# Altium footprint library Connector_PinHeader_2.00mm.PcbLib: 278 footprints (part 1 of 18)
Each footprint in its own frame and in the unit in brackets; x right, y up, seen from the top. Pads: shape width x height; smd on the part's side, far side on the other; paste and mask are expansions set on the pad; w line width, h text height; cw(c..) or ccw(c..) is an arc to the next point about the centre after c.
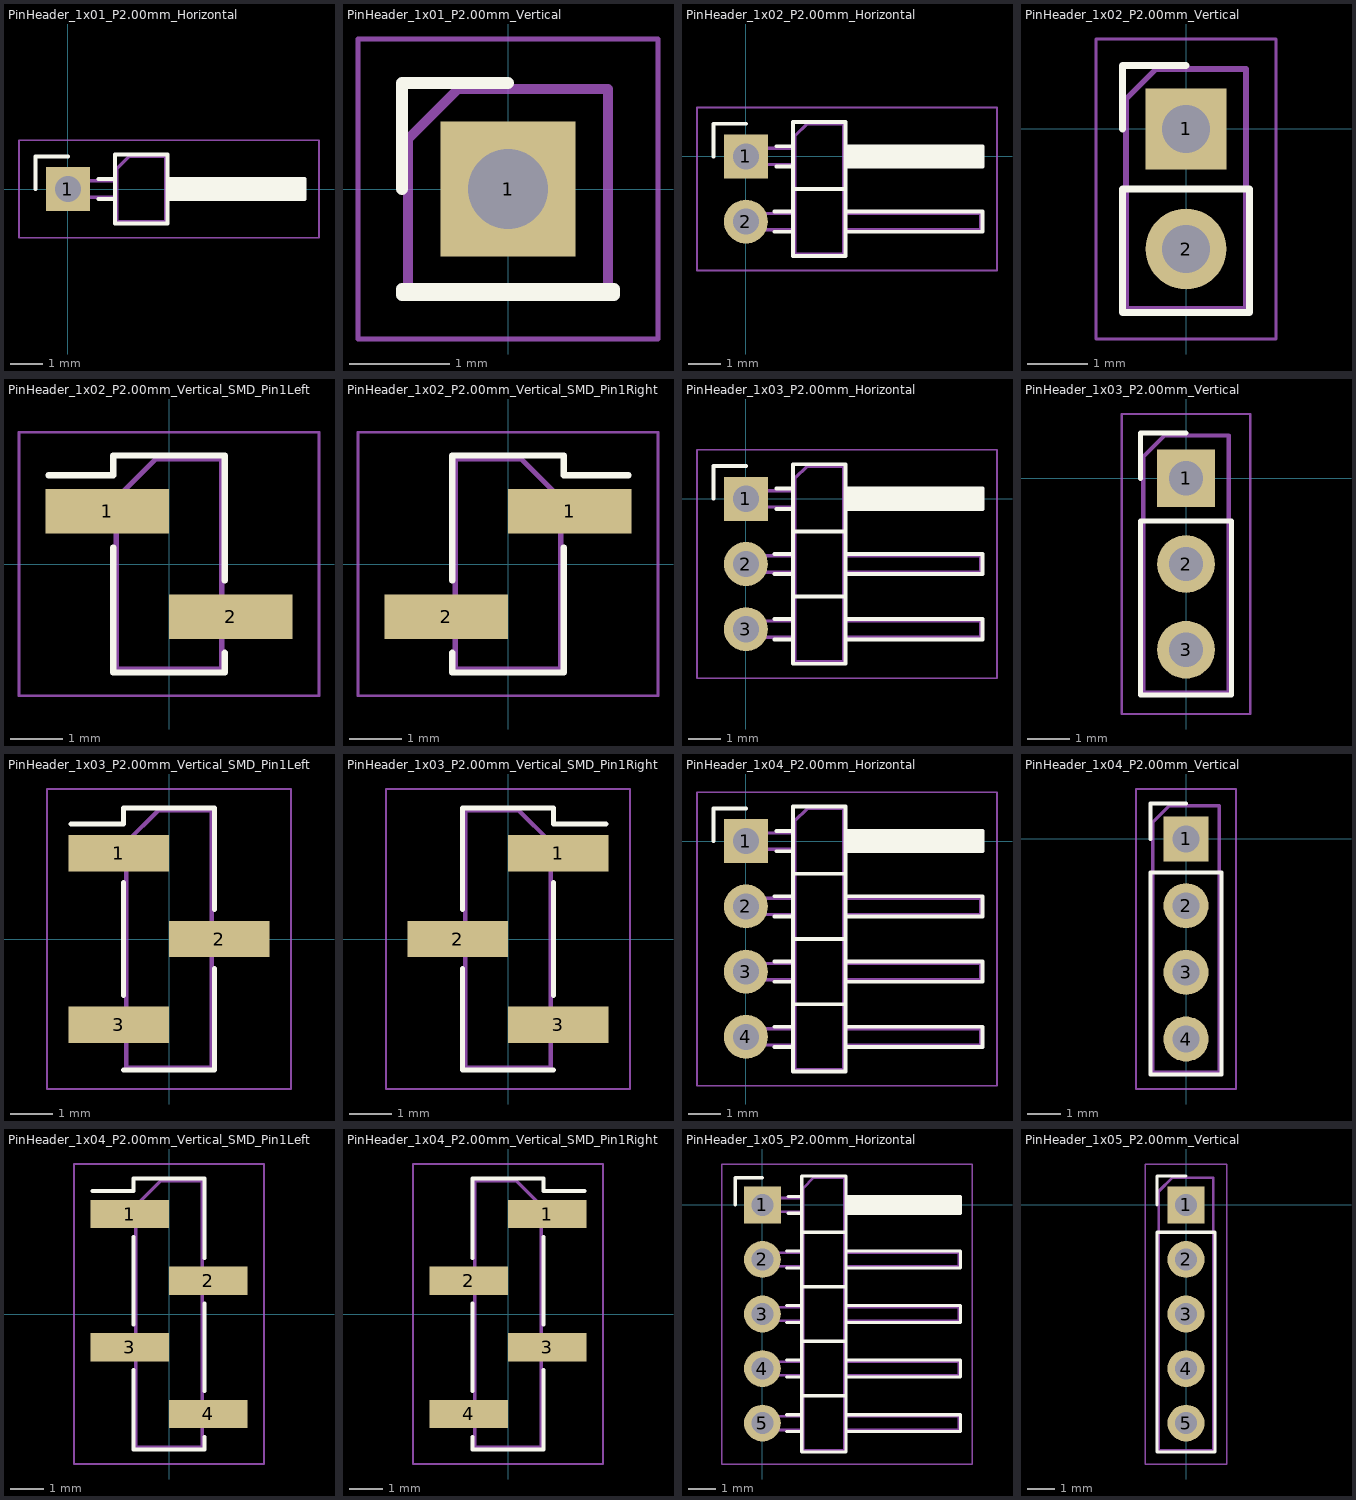
[diagram p0: the footprints below, top view; thin cyan lines are the x and y axes]

## PinHeader_1x01_P2.00mm_Horizontal [mm]
pads (1):
  rect 1.35x1.35 hole 0.8: 1(0,0)
F.SilkS:
  lines w0.12: -1,0 -1,1 0,1 ; 0.935,-0.31 1.44,-0.31 ; 0.935,0.31 1.44,0.31 ; 3.06,-0.31 7.26,-0.31 7.26,0.31 3.06,0.31 ; 3.06,-0.23 7.26,-0.23 ; 3.06,-0.11 7.26,-0.11 ; 3.06,0.01 7.26,0.01 ; 3.06,0.13 7.26,0.13 ; 3.06,0.25 7.26,0.25 ; 1.44,-1.06 1.44,1.06 3.06,1.06 3.06,-1.06 1.44,-1.06
F.CrtYd:
  lines w0.05: -1.5,-1.5 7.7,-1.5 7.7,1.5 -1.5,1.5 -1.5,-1.5
F.Fab:
  lines w0.1: 1.5,-0.25 -0.25,-0.25 -0.25,0.25 1.5,0.25 ; 3,-0.25 7.2,-0.25 7.2,0.25 3,0.25 ; 1.5,-1 1.5,0.625 1.875,1 3,1 3,-1 1.5,-1
  text "'.Designator'" at 3.006,-3.642 h0.9

## PinHeader_1x01_P2.00mm_Vertical [mm]
pads (1):
  rect 1.35x1.35 hole 0.8: 1(0,0)
F.SilkS:
  lines w0.12: -1.06,0 -1.06,1.06 0,1.06 ; -1.06,-1.06 1.06,-1.06 1.06,-1 -1.06,-1 -1.06,-1.06
F.CrtYd:
  lines w0.05: -1.5,-1.5 -1.5,1.5 1.5,1.5 1.5,-1.5 -1.5,-1.5
F.Fab:
  lines w0.1: -1,-1 1,-1 1,1 -0.5,1 -1,0.5 -1,-1
  text "'.Designator'" at 0.84,-4.047 h1

## PinHeader_1x02_P2.00mm_Horizontal [mm]
pads (2):
  rect 1.35x1.35 hole 0.8: 1(0,0)
  rrect100% 1.35x1.35 hole 0.8: 2(0,-2)
F.SilkS:
  lines w0.12: -1,0 -1,1 0,1 ; 0.882,-2.31 1.44,-2.31 ; 0.882,-1.69 1.44,-1.69 ; 0.935,-0.31 1.44,-0.31 ; 0.935,0.31 1.44,0.31 ; 1.44,-1 3.06,-1 ; 3.06,-2.31 7.26,-2.31 7.26,-1.69 3.06,-1.69 ; 3.06,-0.31 7.26,-0.31 7.26,0.31 3.06,0.31 ; 3.06,-0.23 7.26,-0.23 ; 3.06,-0.11 7.26,-0.11 ; 3.06,0.01 7.26,0.01 ; 3.06,0.13 7.26,0.13 ; 3.06,0.25 7.26,0.25 ; 1.44,-3.06 3.06,-3.06 3.06,1.06 1.44,1.06 1.44,-3.06
F.CrtYd:
  lines w0.05: -1.5,-3.5 7.7,-3.5 7.7,1.5 -1.5,1.5 -1.5,-3.5
F.Fab:
  lines w0.1: 1.5,-2.25 -0.25,-2.25 -0.25,-1.75 1.5,-1.75 ; 1.5,-0.25 -0.25,-0.25 -0.25,0.25 1.5,0.25 ; 3,-2.25 7.2,-2.25 7.2,-1.75 3,-1.75 ; 3,-0.25 7.2,-0.25 7.2,0.25 3,0.25 ; 1.5,-3 1.5,0.625 1.875,1 3,1 3,-3 1.5,-3
  text "'.Designator'" at 3.006,-4.642 h0.9

## PinHeader_1x02_P2.00mm_Vertical [mm]
pads (2):
  rect 1.35x1.35 hole 0.8: 1(0,0)
  rrect100% 1.35x1.35 hole 0.8: 2(0,-2)
F.SilkS:
  lines w0.12: -1.06,0 -1.06,1.06 0,1.06 ; -1.06,-3.06 1.06,-3.06 1.06,-1 -1.06,-1 -1.06,-3.06
F.CrtYd:
  lines w0.05: -1.5,-3.5 1.5,-3.5 1.5,1.5 -1.5,1.5 -1.5,-3.5
F.Fab:
  lines w0.1: -1,-3 -1,0.5 -0.5,1 1,1 1,-3 -1,-3
  text "'.Designator'" at 0.84,-5.047 h1

## PinHeader_1x02_P2.00mm_Vertical_SMD_Pin1Left [mm]
pads (2):
  rect 2.35x0.85 smd: 1(-1.175,1) 2(1.175,-1)
F.SilkS:
  lines w0.12: -2.29,1.685 -1.06,1.685 -1.06,2.06 1.06,2.06 1.06,-0.315 ; -1.06,0.315 -1.06,-2.06 1.06,-2.06 1.06,-1.685
F.CrtYd:
  lines w0.05: -2.85,-2.5 2.85,-2.5 2.85,2.5 -2.85,2.5 -2.85,-2.5
F.Fab:
  lines w0.1: -1,0.75 -2.1,0.75 -2.1,1.25 -1,1.25 ; 1,-1.25 2.1,-1.25 2.1,-0.75 1,-0.75 ; -1,1.25 -1,-2 1,-2 1,2 -0.25,2 -1,1.25
  text "'.Designator'" at 0.84,-4.047 h1

## PinHeader_1x02_P2.00mm_Vertical_SMD_Pin1Right [mm]
pads (2):
  rect 2.35x0.85 smd: 1(1.175,1) 2(-1.175,-1)
F.SilkS:
  lines w0.12: -1.06,-1.685 -1.06,-2.06 1.06,-2.06 1.06,0.315 ; -1.06,-0.315 -1.06,2.06 1.06,2.06 1.06,1.685 2.29,1.685
F.CrtYd:
  lines w0.05: -2.85,-2.5 -2.85,2.5 2.85,2.5 2.85,-2.5 -2.85,-2.5
F.Fab:
  lines w0.1: -1,-1.25 -2.1,-1.25 -2.1,-0.75 -1,-0.75 ; 1,0.75 2.1,0.75 2.1,1.25 1,1.25 ; 1,1.25 1,-2 -1,-2 -1,2 0.25,2 1,1.25
  text "'.Designator'" at 0.84,-4.047 h1

## PinHeader_1x03_P2.00mm_Horizontal [mm]
pads (3):
  rect 1.35x1.35 hole 0.8: 1(0,0)
  rrect100% 1.35x1.35 hole 0.8: 2(0,-2) 3(0,-4)
F.SilkS:
  lines w0.12: -1,0 -1,1 0,1 ; 0.882,-4.31 1.44,-4.31 ; 0.882,-3.69 1.44,-3.69 ; 0.882,-2.31 1.44,-2.31 ; 0.882,-1.69 1.44,-1.69 ; 0.935,-0.31 1.44,-0.31 ; 0.935,0.31 1.44,0.31 ; 1.44,-3 3.06,-3 ; 1.44,-1 3.06,-1 ; 3.06,-4.31 7.26,-4.31 7.26,-3.69 3.06,-3.69 ; 3.06,-2.31 7.26,-2.31 7.26,-1.69 3.06,-1.69 ; 3.06,-0.31 7.26,-0.31 7.26,0.31 3.06,0.31 ; 3.06,-0.23 7.26,-0.23 ; 3.06,-0.11 7.26,-0.11 ; 3.06,0.01 7.26,0.01 ; 3.06,0.13 7.26,0.13 ; 3.06,0.25 7.26,0.25 ; 1.44,-5.06 3.06,-5.06 3.06,1.06 1.44,1.06 1.44,-5.06
F.CrtYd:
  lines w0.05: -1.5,-5.5 -1.5,1.5 7.7,1.5 7.7,-5.5 -1.5,-5.5
F.Fab:
  lines w0.1: 1.5,-4.25 -0.25,-4.25 -0.25,-3.75 1.5,-3.75 ; 1.5,-2.25 -0.25,-2.25 -0.25,-1.75 1.5,-1.75 ; 1.5,-0.25 -0.25,-0.25 -0.25,0.25 1.5,0.25 ; 3,-4.25 7.2,-4.25 7.2,-3.75 3,-3.75 ; 3,-2.25 7.2,-2.25 7.2,-1.75 3,-1.75 ; 3,-0.25 7.2,-0.25 7.2,0.25 3,0.25 ; 1.5,-5 1.5,0.625 1.875,1 3,1 3,-5 1.5,-5
  text "'.Designator'" at 3.006,-5.642 h0.9

## PinHeader_1x03_P2.00mm_Vertical [mm]
pads (3):
  rect 1.35x1.35 hole 0.8: 1(0,0)
  rrect100% 1.35x1.35 hole 0.8: 2(0,-2) 3(0,-4)
F.SilkS:
  lines w0.12: -1.06,0 -1.06,1.06 0,1.06 ; -1.06,-5.06 -1.06,-1 1.06,-1 1.06,-5.06 -1.06,-5.06
F.CrtYd:
  lines w0.05: -1.5,-5.5 -1.5,1.5 1.5,1.5 1.5,-5.5 -1.5,-5.5
F.Fab:
  lines w0.1: -1,-5 -1,0.5 -0.5,1 1,1 1,-5 -1,-5
  text "'.Designator'" at 0.84,-6.047 h1

## PinHeader_1x03_P2.00mm_Vertical_SMD_Pin1Left [mm]
pads (3):
  rect 2.35x0.85 smd: 1(-1.175,2) 2(1.175,0) 3(-1.175,-2)
F.SilkS:
  lines w0.12: -2.29,2.685 -1.06,2.685 -1.06,3.06 1.06,3.06 1.06,0.685 ; -1.06,-3.06 1.06,-3.06 ; -1.06,-1.315 -1.06,1.315 ; 1.06,-2.685 1.06,-3.06 ; 1.06,-0.685 1.06,-3.06
F.CrtYd:
  lines w0.05: -2.85,-3.5 -2.85,3.5 2.85,3.5 2.85,-3.5 -2.85,-3.5
F.Fab:
  lines w0.1: -1,-2.25 -2.1,-2.25 -2.1,-1.75 -1,-1.75 ; -1,1.75 -2.1,1.75 -2.1,2.25 -1,2.25 ; 1,-0.25 2.1,-0.25 2.1,0.25 1,0.25 ; -1,2.25 -1,-3 1,-3 1,3 -0.25,3 -1,2.25
  text "'.Designator'" at 0.84,-4.047 h1

## PinHeader_1x03_P2.00mm_Vertical_SMD_Pin1Right [mm]
pads (3):
  rect 2.35x0.85 smd: 1(1.175,2) 2(-1.175,0) 3(1.175,-2)
F.SilkS:
  lines w0.12: -1.06,-2.685 -1.06,-3.06 ; -1.06,-0.685 -1.06,-3.06 ; -1.06,0.685 -1.06,3.06 1.06,3.06 1.06,2.685 2.29,2.685 ; 1.06,-3.06 -1.06,-3.06 ; 1.06,-1.315 1.06,1.315
F.CrtYd:
  lines w0.05: -2.85,-3.5 2.85,-3.5 2.85,3.5 -2.85,3.5 -2.85,-3.5
F.Fab:
  lines w0.1: -1,-0.25 -2.1,-0.25 -2.1,0.25 -1,0.25 ; 1,-2.25 2.1,-2.25 2.1,-1.75 1,-1.75 ; 1,1.75 2.1,1.75 2.1,2.25 1,2.25 ; 1,2.25 1,-3 -1,-3 -1,3 0.25,3 1,2.25
  text "'.Designator'" at 0.84,-4.047 h1

## PinHeader_1x04_P2.00mm_Horizontal [mm]
pads (4):
  rect 1.35x1.35 hole 0.8: 1(0,0)
  rrect100% 1.35x1.35 hole 0.8: 2(0,-2) 3(0,-4) 4(0,-6)
F.SilkS:
  lines w0.12: -1,0 -1,1 0,1 ; 0.882,-6.31 1.44,-6.31 ; 0.882,-5.69 1.44,-5.69 ; 0.882,-4.31 1.44,-4.31 ; 0.882,-3.69 1.44,-3.69 ; 0.882,-2.31 1.44,-2.31 ; 0.882,-1.69 1.44,-1.69 ; 0.935,-0.31 1.44,-0.31 ; 0.935,0.31 1.44,0.31 ; 1.44,-5 3.06,-5 ; 1.44,-3 3.06,-3 ; 1.44,-1 3.06,-1 ; 3.06,-6.31 7.26,-6.31 7.26,-5.69 3.06,-5.69 ; 3.06,-4.31 7.26,-4.31 7.26,-3.69 3.06,-3.69 ; 3.06,-2.31 7.26,-2.31 7.26,-1.69 3.06,-1.69 ; 3.06,-0.31 7.26,-0.31 7.26,0.31 3.06,0.31 ; 3.06,-0.23 7.26,-0.23 ; 3.06,-0.11 7.26,-0.11 ; 3.06,0.01 7.26,0.01 ; 3.06,0.13 7.26,0.13 ; 3.06,0.25 7.26,0.25 ; 1.44,-7.06 1.44,1.06 3.06,1.06 3.06,-7.06 1.44,-7.06
F.CrtYd:
  lines w0.05: -1.5,-7.5 -1.5,1.5 7.7,1.5 7.7,-7.5 -1.5,-7.5
F.Fab:
  lines w0.1: 1.5,-6.25 -0.25,-6.25 -0.25,-5.75 1.5,-5.75 ; 1.5,-4.25 -0.25,-4.25 -0.25,-3.75 1.5,-3.75 ; 1.5,-2.25 -0.25,-2.25 -0.25,-1.75 1.5,-1.75 ; 1.5,-0.25 -0.25,-0.25 -0.25,0.25 1.5,0.25 ; 3,-6.25 7.2,-6.25 7.2,-5.75 3,-5.75 ; 3,-4.25 7.2,-4.25 7.2,-3.75 3,-3.75 ; 3,-2.25 7.2,-2.25 7.2,-1.75 3,-1.75 ; 3,-0.25 7.2,-0.25 7.2,0.25 3,0.25 ; 1.5,-7 1.5,0.625 1.875,1 3,1 3,-7 1.5,-7
  text "'.Designator'" at 3.006,-6.642 h0.9

## PinHeader_1x04_P2.00mm_Vertical [mm]
pads (4):
  rect 1.35x1.35 hole 0.8: 1(0,0)
  rrect100% 1.35x1.35 hole 0.8: 2(0,-2) 3(0,-4) 4(0,-6)
F.SilkS:
  lines w0.12: -1.06,0 -1.06,1.06 0,1.06 ; -1.06,-7.06 1.06,-7.06 1.06,-1 -1.06,-1 -1.06,-7.06
F.CrtYd:
  lines w0.05: -1.5,-7.5 -1.5,1.5 1.5,1.5 1.5,-7.5 -1.5,-7.5
F.Fab:
  lines w0.1: -1,-7 -1,0.5 -0.5,1 1,1 1,-7 -1,-7
  text "'.Designator'" at 0.84,-7.047 h1

## PinHeader_1x04_P2.00mm_Vertical_SMD_Pin1Left [mm]
pads (4):
  rect 2.35x0.85 smd: 1(-1.175,3) 2(1.175,1) 3(-1.175,-1) 4(1.175,-3)
F.SilkS:
  lines w0.12: -2.29,3.685 -1.06,3.685 -1.06,4.06 1.06,4.06 1.06,1.685 ; -1.06,-1.685 -1.06,-4.06 1.06,-4.06 1.06,-3.685 ; -1.06,-0.315 -1.06,2.315 ; 1.06,-2.315 1.06,0.315
F.CrtYd:
  lines w0.05: -2.85,-4.5 -2.85,4.5 2.85,4.5 2.85,-4.5 -2.85,-4.5
F.Fab:
  lines w0.1: -1,-1.25 -2.1,-1.25 -2.1,-0.75 -1,-0.75 ; -1,2.75 -2.1,2.75 -2.1,3.25 -1,3.25 ; 1,-3.25 2.1,-3.25 2.1,-2.75 1,-2.75 ; 1,0.75 2.1,0.75 2.1,1.25 1,1.25 ; -1,3.25 -0.25,4 1,4 1,-4 -1,-4 -1,3.25
  text "'.Designator'" at 0.84,-4.047 h1

## PinHeader_1x04_P2.00mm_Vertical_SMD_Pin1Right [mm]
pads (4):
  rect 2.35x0.85 smd: 1(1.175,3) 2(-1.175,1) 3(1.175,-1) 4(-1.175,-3)
F.SilkS:
  lines w0.12: -1.06,-3.685 -1.06,-4.06 1.06,-4.06 1.06,-1.685 ; -1.06,-2.315 -1.06,0.315 ; -1.06,1.685 -1.06,4.06 1.06,4.06 1.06,3.685 2.29,3.685 ; 1.06,-0.315 1.06,2.315
F.CrtYd:
  lines w0.05: -2.85,-4.5 2.85,-4.5 2.85,4.5 -2.85,4.5 -2.85,-4.5
F.Fab:
  lines w0.1: -1,-3.25 -2.1,-3.25 -2.1,-2.75 -1,-2.75 ; -1,0.75 -2.1,0.75 -2.1,1.25 -1,1.25 ; 1,-1.25 2.1,-1.25 2.1,-0.75 1,-0.75 ; 1,2.75 2.1,2.75 2.1,3.25 1,3.25 ; 1,3.25 0.25,4 -1,4 -1,-4 1,-4 1,3.25
  text "'.Designator'" at 0.84,-4.047 h1

## PinHeader_1x05_P2.00mm_Horizontal [mm]
pads (5):
  rect 1.35x1.35 hole 0.8: 1(0,0)
  rrect100% 1.35x1.35 hole 0.8: 2(0,-2) 3(0,-4) 4(0,-6) 5(0,-8)
F.SilkS:
  lines w0.12: -1,0 -1,1 0,1 ; 0.882,-8.31 1.44,-8.31 ; 0.882,-7.69 1.44,-7.69 ; 0.882,-6.31 1.44,-6.31 ; 0.882,-5.69 1.44,-5.69 ; 0.882,-4.31 1.44,-4.31 ; 0.882,-3.69 1.44,-3.69 ; 0.882,-2.31 1.44,-2.31 ; 0.882,-1.69 1.44,-1.69 ; 0.935,-0.31 1.44,-0.31 ; 0.935,0.31 1.44,0.31 ; 1.44,-7 3.06,-7 ; 1.44,-5 3.06,-5 ; 1.44,-3 3.06,-3 ; 1.44,-1 3.06,-1 ; 3.06,-8.31 7.26,-8.31 7.26,-7.69 3.06,-7.69 ; 3.06,-6.31 7.26,-6.31 7.26,-5.69 3.06,-5.69 ; 3.06,-4.31 7.26,-4.31 7.26,-3.69 3.06,-3.69 ; 3.06,-2.31 7.26,-2.31 7.26,-1.69 3.06,-1.69 ; 3.06,-0.31 7.26,-0.31 7.26,0.31 3.06,0.31 ; 3.06,-0.23 7.26,-0.23 ; 3.06,-0.11 7.26,-0.11 ; 3.06,0.01 7.26,0.01 ; 3.06,0.13 7.26,0.13 ; 3.06,0.25 7.26,0.25 ; 1.44,-9.06 1.44,1.06 3.06,1.06 3.06,-9.06 1.44,-9.06
F.CrtYd:
  lines w0.05: -1.5,-9.5 -1.5,1.5 7.7,1.5 7.7,-9.5 -1.5,-9.5
F.Fab:
  lines w0.1: 1.5,-8.25 -0.25,-8.25 -0.25,-7.75 1.5,-7.75 ; 1.5,-6.25 -0.25,-6.25 -0.25,-5.75 1.5,-5.75 ; 1.5,-4.25 -0.25,-4.25 -0.25,-3.75 1.5,-3.75 ; 1.5,-2.25 -0.25,-2.25 -0.25,-1.75 1.5,-1.75 ; 1.5,-0.25 -0.25,-0.25 -0.25,0.25 1.5,0.25 ; 3,-8.25 7.2,-8.25 7.2,-7.75 3,-7.75 ; 3,-6.25 7.2,-6.25 7.2,-5.75 3,-5.75 ; 3,-4.25 7.2,-4.25 7.2,-3.75 3,-3.75 ; 3,-2.25 7.2,-2.25 7.2,-1.75 3,-1.75 ; 3,-0.25 7.2,-0.25 7.2,0.25 3,0.25 ; 1.5,-9 1.5,0.625 1.875,1 3,1 3,-9 1.5,-9
  text "'.Designator'" at 3.006,-7.642 h0.9

## PinHeader_1x05_P2.00mm_Vertical [mm]
pads (5):
  rect 1.35x1.35 hole 0.8: 1(0,0)
  rrect100% 1.35x1.35 hole 0.8: 2(0,-2) 3(0,-4) 4(0,-6) 5(0,-8)
F.SilkS:
  lines w0.12: -1.06,0 -1.06,1.06 0,1.06 ; -1.06,-9.06 1.06,-9.06 1.06,-1 -1.06,-1 -1.06,-9.06
F.CrtYd:
  lines w0.05: -1.5,-9.5 1.5,-9.5 1.5,1.5 -1.5,1.5 -1.5,-9.5
F.Fab:
  lines w0.1: -1,-9 -1,0.5 -0.5,1 1,1 1,-9 -1,-9
  text "'.Designator'" at 0.84,-8.047 h1